# Altium footprint library fpga_modules.PcbLib: 2 footprints
Each footprint in its own frame and in the unit in brackets; x right, y up, seen from the top. Pads: shape width x height; smd on the part's side, far side on the other; paste and mask are expansions set on the pad; w line width, h text height; cw(c..) or ccw(c..) is an arc to the next point about the centre after c.
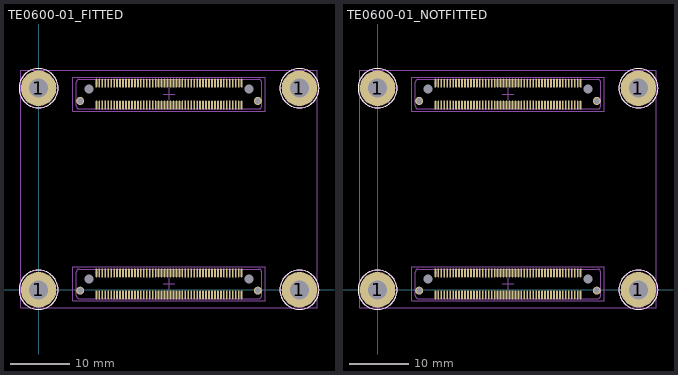
[diagram p0: the footprints below, top view; thin cyan lines are the x and y axes]

## TE0600-01_FITTED [mm] "GigaBee XC6SLX45-2 TE0600-01"
pads (212):
  round 6 hole 3.2: 1(0,0) 1(0,34) 1(44,0) 1(44,34)
  round 1.35 hole 1: F1(7.025,-0.15) F1(7.025,31.85) F2(36.975,-0.15) F2(36.975,31.85)
  round 0 hole 1.5 unplated mask+0.75: H1(8.5,1.85) H1(8.5,33.85) H2(35.5,1.85) H2(35.5,33.85)
  oval 0.3x1.5 smd: J1-1(9.75,2.85) J1-2(9.75,-0.85) J1-3(10.25,2.85) J1-4(10.25,-0.85) J1-5(10.75,2.85) J1-6(10.75,-0.85) J1-7(11.25,2.85) J1-8(11.25,-0.85) J1-9(11.75,2.85) J1-10(11.75,-0.85) J1-11(12.25,2.85) J1-12(12.25,-0.85) J1-13(12.75,2.85) J1-14(12.75,-0.85) J1-15(13.25,2.85) J1-16(13.25,-0.85) J1-17(13.75,2.85) J1-18(13.75,-0.85) J1-19(14.25,2.85) J1-20(14.25,-0.85) J1-21(14.75,2.85) J1-22(14.75,-0.85) J1-23(15.25,2.85) J1-24(15.25,-0.85) J1-25(15.75,2.85) J1-26(15.75,-0.85) J1-27(16.25,2.85) J1-28(16.25,-0.85) J1-29(16.75,2.85) J1-30(16.75,-0.85) J1-31(17.25,2.85) J1-32(17.25,-0.85) J1-33(17.75,2.85) J1-34(17.75,-0.85) J1-35(18.25,2.85) J1-36(18.25,-0.85) J1-37(18.75,2.85) J1-38(18.75,-0.85) J1-39(19.25,2.85) J1-40(19.25,-0.85) J1-41(19.75,2.85) J1-42(19.75,-0.85) J1-43(20.25,2.85) J1-44(20.25,-0.85) J1-45(20.75,2.85) J1-46(20.75,-0.85) J1-47(21.25,2.85) J1-48(21.25,-0.85) J1-49(21.75,2.85) J1-50(21.75,-0.85) J1-51(22.25,2.85) J1-52(22.25,-0.85) J1-53(22.75,2.85) J1-54(22.75,-0.85) J1-55(23.25,2.85) J1-56(23.25,-0.85) J1-57(23.75,2.85) J1-58(23.75,-0.85) J1-59(24.25,2.85) J1-60(24.25,-0.85) J1-61(24.75,2.85) J1-62(24.75,-0.85) J1-63(25.25,2.85) J1-64(25.25,-0.85) J1-65(25.75,2.85) J1-66(25.75,-0.85) J1-67(26.25,2.85) J1-68(26.25,-0.85) J1-69(26.75,2.85) J1-70(26.75,-0.85) J1-71(27.25,2.85) J1-72(27.25,-0.85) J1-73(27.75,2.85) J1-74(27.75,-0.85) J1-75(28.25,2.85) J1-76(28.25,-0.85) J1-77(28.75,2.85) J1-78(28.75,-0.85) J1-79(29.25,2.85) J1-80(29.25,-0.85) J1-81(29.75,2.85) J1-82(29.75,-0.85) J1-83(30.25,2.85) J1-84(30.25,-0.85) J1-85(30.75,2.85) J1-86(30.75,-0.85) J1-87(31.25,2.85) J1-88(31.25,-0.85) J1-89(31.75,2.85) J1-90(31.75,-0.85) J1-91(32.25,2.85) J1-92(32.25,-0.85) J1-93(32.75,2.85) J1-94(32.75,-0.85) J1-95(33.25,2.85) J1-96(33.25,-0.85) J1-97(33.75,2.85) J1-98(33.75,-0.85) J1-99(34.25,2.85) J1-100(34.25,-0.85) J2-1(9.75,34.85) J2-2(9.75,31.15) J2-3(10.25,34.85) J2-4(10.25,31.15) J2-5(10.75,34.85) J2-6(10.75,31.15) J2-7(11.25,34.85) J2-8(11.25,31.15) J2-9(11.75,34.85) J2-10(11.75,31.15) J2-11(12.25,34.85) J2-12(12.25,31.15) J2-13(12.75,34.85) J2-14(12.75,31.15) J2-15(13.25,34.85) J2-16(13.25,31.15) J2-17(13.75,34.85) J2-18(13.75,31.15) J2-19(14.25,34.85) J2-20(14.25,31.15) J2-21(14.75,34.85) J2-22(14.75,31.15) J2-23(15.25,34.85) J2-24(15.25,31.15) J2-25(15.75,34.85) J2-26(15.75,31.15) J2-27(16.25,34.85) J2-28(16.25,31.15) J2-29(16.75,34.85) J2-30(16.75,31.15) J2-31(17.25,34.85) J2-32(17.25,31.15) J2-33(17.75,34.85) J2-34(17.75,31.15) J2-35(18.25,34.85) J2-36(18.25,31.15) J2-37(18.75,34.85) J2-38(18.75,31.15) J2-39(19.25,34.85) J2-40(19.25,31.15) J2-41(19.75,34.85) J2-42(19.75,31.15) J2-43(20.25,34.85) J2-44(20.25,31.15) J2-45(20.75,34.85) J2-46(20.75,31.15) J2-47(21.25,34.85) J2-48(21.25,31.15) J2-49(21.75,34.85) J2-50(21.75,31.15) J2-51(22.25,34.85) J2-52(22.25,31.15) J2-53(22.75,34.85) J2-54(22.75,31.15) J2-55(23.25,34.85) J2-56(23.25,31.15) J2-57(23.75,34.85) J2-58(23.75,31.15) J2-59(24.25,34.85) J2-60(24.25,31.15) J2-61(24.75,34.85) J2-62(24.75,31.15) J2-63(25.25,34.85) J2-64(25.25,31.15) J2-65(25.75,34.85) J2-66(25.75,31.15) J2-67(26.25,34.85) J2-68(26.25,31.15) J2-69(26.75,34.85) J2-70(26.75,31.15) J2-71(27.25,34.85) J2-72(27.25,31.15) J2-73(27.75,34.85) J2-74(27.75,31.15) J2-75(28.25,34.85) J2-76(28.25,31.15) J2-77(28.75,34.85) J2-78(28.75,31.15) J2-79(29.25,34.85) J2-80(29.25,31.15) J2-81(29.75,34.85) J2-82(29.75,31.15) J2-83(30.25,34.85) J2-84(30.25,31.15) J2-85(30.75,34.85) J2-86(30.75,31.15) J2-87(31.25,34.85) J2-88(31.25,31.15) J2-89(31.75,34.85) J2-90(31.75,31.15) J2-91(32.25,34.85) J2-92(32.25,31.15) J2-93(32.75,34.85) J2-94(32.75,31.15) J2-95(33.25,34.85) J2-96(33.25,31.15) J2-97(33.75,34.85) J2-98(33.75,31.15) J2-99(34.25,34.85) J2-100(34.25,31.15)
Top Overlay:
  circle w0.2: c44,34 r3.3
  circle w0.2: c44,0 r3.3
  circle w0.2: c0,34 r3.3
  circle w0.2: c0,0 r3.3
Mechanical 5:
  circle w0.1: c44,34 r3.25
  circle w0.1: c44,0 r3.25
  circle w0.1: c0,34 r3.25
  circle w0.1: c0,0 r3.25
  lines w0.1: -2,-0.5 -0.5,-0.5 -0.5,-2 0.5,-2 0.5,-0.5 2,-0.5 2,0.5 0.5,0.5 0.5,2 -0.5,2 -0.5,0.5 -2,0.5 -2,-0.5 ; -2,33.5 -0.5,33.5 -0.5,32 0.5,32 0.5,33.5 2,33.5 2,34.5 0.5,34.5 0.5,36 -0.5,36 -0.5,34.5 -2,34.5 -2,33.5 ; 42,-0.5 43.5,-0.5 43.5,-2 44.5,-2 44.5,-0.5 46,-0.5 46,0.5 44.5,0.5 44.5,2 43.5,2 43.5,0.5 42,0.5 42,-0.5 ; 42,33.5 43.5,33.5 43.5,32 44.5,32 44.5,33.5 46,33.5 46,34.5 44.5,34.5 44.5,36 43.5,36 43.5,34.5 42,34.5 42,33.5
Mechanical 6:
  lines w0.01: -3,-3 47,-3 47,37 -3,37 -3,-3
Mechanical 13:
  circle w0.3: c9.76,2.85 r0.01
  circle w0.3: c9.76,34.85 r0.01
  circle w0.1: c44,34 r1.6
  circle w0.1: c44,34 r3.25
  circle w0.1: c44,0 r1.6
  circle w0.1: c44,0 r3.25
  circle w0.1: c0,34 r1.6
  circle w0.1: c0,34 r3.25
  circle w0.1: c0,0 r1.6
  circle w0.1: c0,0 r3.25
  lines w0.1: 37.125,-1.49 ccw(c37.125,-0.99) 37.625,-0.99 37.625,2.99 ccw(c37.125,2.99) 37.125,3.49 6.875,3.49 ccw(c6.875,2.99) 6.375,2.99 6.375,-0.99 ccw(c6.875,-0.99) 6.875,-1.49 37.125,-1.49 ; 37.125,-1.49 37.125,-1.49 ; 37.125,30.51 ccw(c37.125,31.01) 37.625,31.01 37.625,34.99 ccw(c37.125,34.99) 37.125,35.49 6.875,35.49 ccw(c6.875,34.99) 6.375,34.99 6.375,31.01 ccw(c6.875,31.01) 6.875,30.51 37.125,30.51 ; 37.125,30.51 37.125,30.51
  text ".Designator" at 20.725,0.475 h1
  text "1" at 9.5,3.1 h0.5
  text "2" at 9.5,-0.6 h0.5
  text "99" at 35.3,3 h0.5
  text "100" at 35.75,-0.5 h0.5
  text "100" at 35.75,31.5 h0.5
  text "99" at 35.3,35 h0.5
  text "2" at 9.5,31.4 h0.5
  text "1" at 9.5,35.1 h0.5
  text ".Designator" at 20.525,32.375 h1
Mechanical 14:
  circle w0.1: c44,34 r3.25
  circle w0.1: c44,34 r1.6
  circle w0.1: c44,0 r3.25
  circle w0.1: c44,0 r1.6
  circle w0.1: c0,34 r3.25
  circle w0.1: c0,34 r1.6
  circle w0.1: c0,0 r3.25
  circle w0.1: c0,0 r1.6
Mechanical 15:
  circle w0.05: c44,34 r3.3
  circle w0.05: c44,0 r3.3
  circle w0.05: c0,34 r3.3
  circle w0.05: c0,0 r3.3
  lines w0.05: -1,0 1,0 ; -1,34 1,34 ; 0,-1 0,1 ; 0,33 0,35 ; 21,1 23,1 ; 21,33 23,33 ; 22,0 22,2 ; 22,32 22,34 ; 43,0 45,0 ; 43,34 45,34 ; 44,-1 44,1 ; 44,33 44,35 ; 5.75,-1.85 38.25,-1.85 38.25,3.85 5.75,3.85 5.75,-1.85 ; 5.75,30.15 38.25,30.15 38.25,35.85 5.75,35.85 5.75,30.15
Mechanical 16:
  circle w0.05: c44,34 r3.3
  circle w0.05: c44,0 r3.3
  circle w0.05: c0,34 r3.3
  circle w0.05: c0,0 r3.3
3D body: height 3.95, standoff -1.65, extent 6.602,-1.64 37.4,3.49
3D body: height 3.95, standoff -1.65, extent 6.602,30.36 37.4,35.49
3D body: height 9.71, standoff 0.85, extent -3,-3 47,37

## TE0600-01_NOTFITTED [mm] "GigaBee XC6SLX45-2 TE0600-01"
pads (212):
  round 6 hole 3.2: 1(0,0) 1(0,34) 1(44,0) 1(44,34)
  round 1.35 hole 1: F1(7.025,-0.15) F1(7.025,31.85) F2(36.975,-0.15) F2(36.975,31.85)
  round 0 hole 1.5 unplated mask+0.75: H1(8.5,1.85) H1(8.5,33.85) H2(35.5,1.85) H2(35.5,33.85)
  oval 0.3x1.5 smd: J1-1(9.75,2.85) J1-2(9.75,-0.85) J1-3(10.25,2.85) J1-4(10.25,-0.85) J1-5(10.75,2.85) J1-6(10.75,-0.85) J1-7(11.25,2.85) J1-8(11.25,-0.85) J1-9(11.75,2.85) J1-10(11.75,-0.85) J1-11(12.25,2.85) J1-12(12.25,-0.85) J1-13(12.75,2.85) J1-14(12.75,-0.85) J1-15(13.25,2.85) J1-16(13.25,-0.85) J1-17(13.75,2.85) J1-18(13.75,-0.85) J1-19(14.25,2.85) J1-20(14.25,-0.85) J1-21(14.75,2.85) J1-22(14.75,-0.85) J1-23(15.25,2.85) J1-24(15.25,-0.85) J1-25(15.75,2.85) J1-26(15.75,-0.85) J1-27(16.25,2.85) J1-28(16.25,-0.85) J1-29(16.75,2.85) J1-30(16.75,-0.85) J1-31(17.25,2.85) J1-32(17.25,-0.85) J1-33(17.75,2.85) J1-34(17.75,-0.85) J1-35(18.25,2.85) J1-36(18.25,-0.85) J1-37(18.75,2.85) J1-38(18.75,-0.85) J1-39(19.25,2.85) J1-40(19.25,-0.85) J1-41(19.75,2.85) J1-42(19.75,-0.85) J1-43(20.25,2.85) J1-44(20.25,-0.85) J1-45(20.75,2.85) J1-46(20.75,-0.85) J1-47(21.25,2.85) J1-48(21.25,-0.85) J1-49(21.75,2.85) J1-50(21.75,-0.85) J1-51(22.25,2.85) J1-52(22.25,-0.85) J1-53(22.75,2.85) J1-54(22.75,-0.85) J1-55(23.25,2.85) J1-56(23.25,-0.85) J1-57(23.75,2.85) J1-58(23.75,-0.85) J1-59(24.25,2.85) J1-60(24.25,-0.85) J1-61(24.75,2.85) J1-62(24.75,-0.85) J1-63(25.25,2.85) J1-64(25.25,-0.85) J1-65(25.75,2.85) J1-66(25.75,-0.85) J1-67(26.25,2.85) J1-68(26.25,-0.85) J1-69(26.75,2.85) J1-70(26.75,-0.85) J1-71(27.25,2.85) J1-72(27.25,-0.85) J1-73(27.75,2.85) J1-74(27.75,-0.85) J1-75(28.25,2.85) J1-76(28.25,-0.85) J1-77(28.75,2.85) J1-78(28.75,-0.85) J1-79(29.25,2.85) J1-80(29.25,-0.85) J1-81(29.75,2.85) J1-82(29.75,-0.85) J1-83(30.25,2.85) J1-84(30.25,-0.85) J1-85(30.75,2.85) J1-86(30.75,-0.85) J1-87(31.25,2.85) J1-88(31.25,-0.85) J1-89(31.75,2.85) J1-90(31.75,-0.85) J1-91(32.25,2.85) J1-92(32.25,-0.85) J1-93(32.75,2.85) J1-94(32.75,-0.85) J1-95(33.25,2.85) J1-96(33.25,-0.85) J1-97(33.75,2.85) J1-98(33.75,-0.85) J1-99(34.25,2.85) J1-100(34.25,-0.85) J2-1(9.75,34.85) J2-2(9.75,31.15) J2-3(10.25,34.85) J2-4(10.25,31.15) J2-5(10.75,34.85) J2-6(10.75,31.15) J2-7(11.25,34.85) J2-8(11.25,31.15) J2-9(11.75,34.85) J2-10(11.75,31.15) J2-11(12.25,34.85) J2-12(12.25,31.15) J2-13(12.75,34.85) J2-14(12.75,31.15) J2-15(13.25,34.85) J2-16(13.25,31.15) J2-17(13.75,34.85) J2-18(13.75,31.15) J2-19(14.25,34.85) J2-20(14.25,31.15) J2-21(14.75,34.85) J2-22(14.75,31.15) J2-23(15.25,34.85) J2-24(15.25,31.15) J2-25(15.75,34.85) J2-26(15.75,31.15) J2-27(16.25,34.85) J2-28(16.25,31.15) J2-29(16.75,34.85) J2-30(16.75,31.15) J2-31(17.25,34.85) J2-32(17.25,31.15) J2-33(17.75,34.85) J2-34(17.75,31.15) J2-35(18.25,34.85) J2-36(18.25,31.15) J2-37(18.75,34.85) J2-38(18.75,31.15) J2-39(19.25,34.85) J2-40(19.25,31.15) J2-41(19.75,34.85) J2-42(19.75,31.15) J2-43(20.25,34.85) J2-44(20.25,31.15) J2-45(20.75,34.85) J2-46(20.75,31.15) J2-47(21.25,34.85) J2-48(21.25,31.15) J2-49(21.75,34.85) J2-50(21.75,31.15) J2-51(22.25,34.85) J2-52(22.25,31.15) J2-53(22.75,34.85) J2-54(22.75,31.15) J2-55(23.25,34.85) J2-56(23.25,31.15) J2-57(23.75,34.85) J2-58(23.75,31.15) J2-59(24.25,34.85) J2-60(24.25,31.15) J2-61(24.75,34.85) J2-62(24.75,31.15) J2-63(25.25,34.85) J2-64(25.25,31.15) J2-65(25.75,34.85) J2-66(25.75,31.15) J2-67(26.25,34.85) J2-68(26.25,31.15) J2-69(26.75,34.85) J2-70(26.75,31.15) J2-71(27.25,34.85) J2-72(27.25,31.15) J2-73(27.75,34.85) J2-74(27.75,31.15) J2-75(28.25,34.85) J2-76(28.25,31.15) J2-77(28.75,34.85) J2-78(28.75,31.15) J2-79(29.25,34.85) J2-80(29.25,31.15) J2-81(29.75,34.85) J2-82(29.75,31.15) J2-83(30.25,34.85) J2-84(30.25,31.15) J2-85(30.75,34.85) J2-86(30.75,31.15) J2-87(31.25,34.85) J2-88(31.25,31.15) J2-89(31.75,34.85) J2-90(31.75,31.15) J2-91(32.25,34.85) J2-92(32.25,31.15) J2-93(32.75,34.85) J2-94(32.75,31.15) J2-95(33.25,34.85) J2-96(33.25,31.15) J2-97(33.75,34.85) J2-98(33.75,31.15) J2-99(34.25,34.85) J2-100(34.25,31.15)
Top Overlay:
  circle w0.2: c44,34 r3.3
  circle w0.2: c44,0 r3.3
  circle w0.2: c0,34 r3.3
  circle w0.2: c0,0 r3.3
Mechanical 5:
  circle w0.1: c44,34 r3.25
  circle w0.1: c44,0 r3.25
  circle w0.1: c0,34 r3.25
  circle w0.1: c0,0 r3.25
  lines w0.1: -2,-0.5 -0.5,-0.5 -0.5,-2 0.5,-2 0.5,-0.5 2,-0.5 2,0.5 0.5,0.5 0.5,2 -0.5,2 -0.5,0.5 -2,0.5 -2,-0.5 ; -2,33.5 -0.5,33.5 -0.5,32 0.5,32 0.5,33.5 2,33.5 2,34.5 0.5,34.5 0.5,36 -0.5,36 -0.5,34.5 -2,34.5 -2,33.5 ; 42,-0.5 43.5,-0.5 43.5,-2 44.5,-2 44.5,-0.5 46,-0.5 46,0.5 44.5,0.5 44.5,2 43.5,2 43.5,0.5 42,0.5 42,-0.5 ; 42,33.5 43.5,33.5 43.5,32 44.5,32 44.5,33.5 46,33.5 46,34.5 44.5,34.5 44.5,36 43.5,36 43.5,34.5 42,34.5 42,33.5
Mechanical 6:
  lines w0.01: -3,-3 47,-3 47,37 -3,37 -3,-3
Mechanical 13:
  circle w0.3: c9.76,2.85 r0.01
  circle w0.3: c9.76,34.85 r0.01
  circle w0.1: c44,34 r1.6
  circle w0.1: c44,34 r3.25
  circle w0.1: c44,0 r1.6
  circle w0.1: c44,0 r3.25
  circle w0.1: c0,34 r1.6
  circle w0.1: c0,34 r3.25
  circle w0.1: c0,0 r1.6
  circle w0.1: c0,0 r3.25
  lines w0.1: 37.125,-1.49 ccw(c37.125,-0.99) 37.625,-0.99 37.625,2.99 ccw(c37.125,2.99) 37.125,3.49 6.875,3.49 ccw(c6.875,2.99) 6.375,2.99 6.375,-0.99 ccw(c6.875,-0.99) 6.875,-1.49 37.125,-1.49 ; 37.125,-1.49 37.125,-1.49 ; 37.125,30.51 ccw(c37.125,31.01) 37.625,31.01 37.625,34.99 ccw(c37.125,34.99) 37.125,35.49 6.875,35.49 ccw(c6.875,34.99) 6.375,34.99 6.375,31.01 ccw(c6.875,31.01) 6.875,30.51 37.125,30.51 ; 37.125,30.51 37.125,30.51
  text ".Designator" at 20.725,0.475 h1
  text "1" at 9.5,3.1 h0.5
  text "2" at 9.5,-0.6 h0.5
  text "99" at 35.3,3 h0.5
  text "100" at 35.75,-0.5 h0.5
  text "100" at 35.75,31.5 h0.5
  text "99" at 35.3,35 h0.5
  text "2" at 9.5,31.4 h0.5
  text "1" at 9.5,35.1 h0.5
  text ".Designator" at 20.525,32.375 h1
Mechanical 14:
  circle w0.1: c44,34 r3.25
  circle w0.1: c44,34 r1.6
  circle w0.1: c44,0 r3.25
  circle w0.1: c44,0 r1.6
  circle w0.1: c0,34 r3.25
  circle w0.1: c0,34 r1.6
  circle w0.1: c0,0 r3.25
  circle w0.1: c0,0 r1.6
Mechanical 15:
  circle w0.05: c44,34 r3.3
  circle w0.05: c44,0 r3.3
  circle w0.05: c0,34 r3.3
  circle w0.05: c0,0 r3.3
  lines w0.05: -1,0 1,0 ; -1,34 1,34 ; 0,-1 0,1 ; 0,33 0,35 ; 21,1 23,1 ; 21,33 23,33 ; 22,0 22,2 ; 22,32 22,34 ; 43,0 45,0 ; 43,34 45,34 ; 44,-1 44,1 ; 44,33 44,35 ; 5.75,-1.85 38.25,-1.85 38.25,3.85 5.75,3.85 5.75,-1.85 ; 5.75,30.15 38.25,30.15 38.25,35.85 5.75,35.85 5.75,30.15
Mechanical 16:
  circle w0.05: c44,34 r3.3
  circle w0.05: c44,0 r3.3
  circle w0.05: c0,34 r3.3
  circle w0.05: c0,0 r3.3
3D body: height 3.95, standoff -1.65, extent 6.602,-1.64 37.4,3.49
3D body: height 3.95, standoff -1.65, extent 6.602,30.36 37.4,35.49